# Altium schematic symbol library IC_Maxim.SchLib: 843 symbols (part 18 of 20)
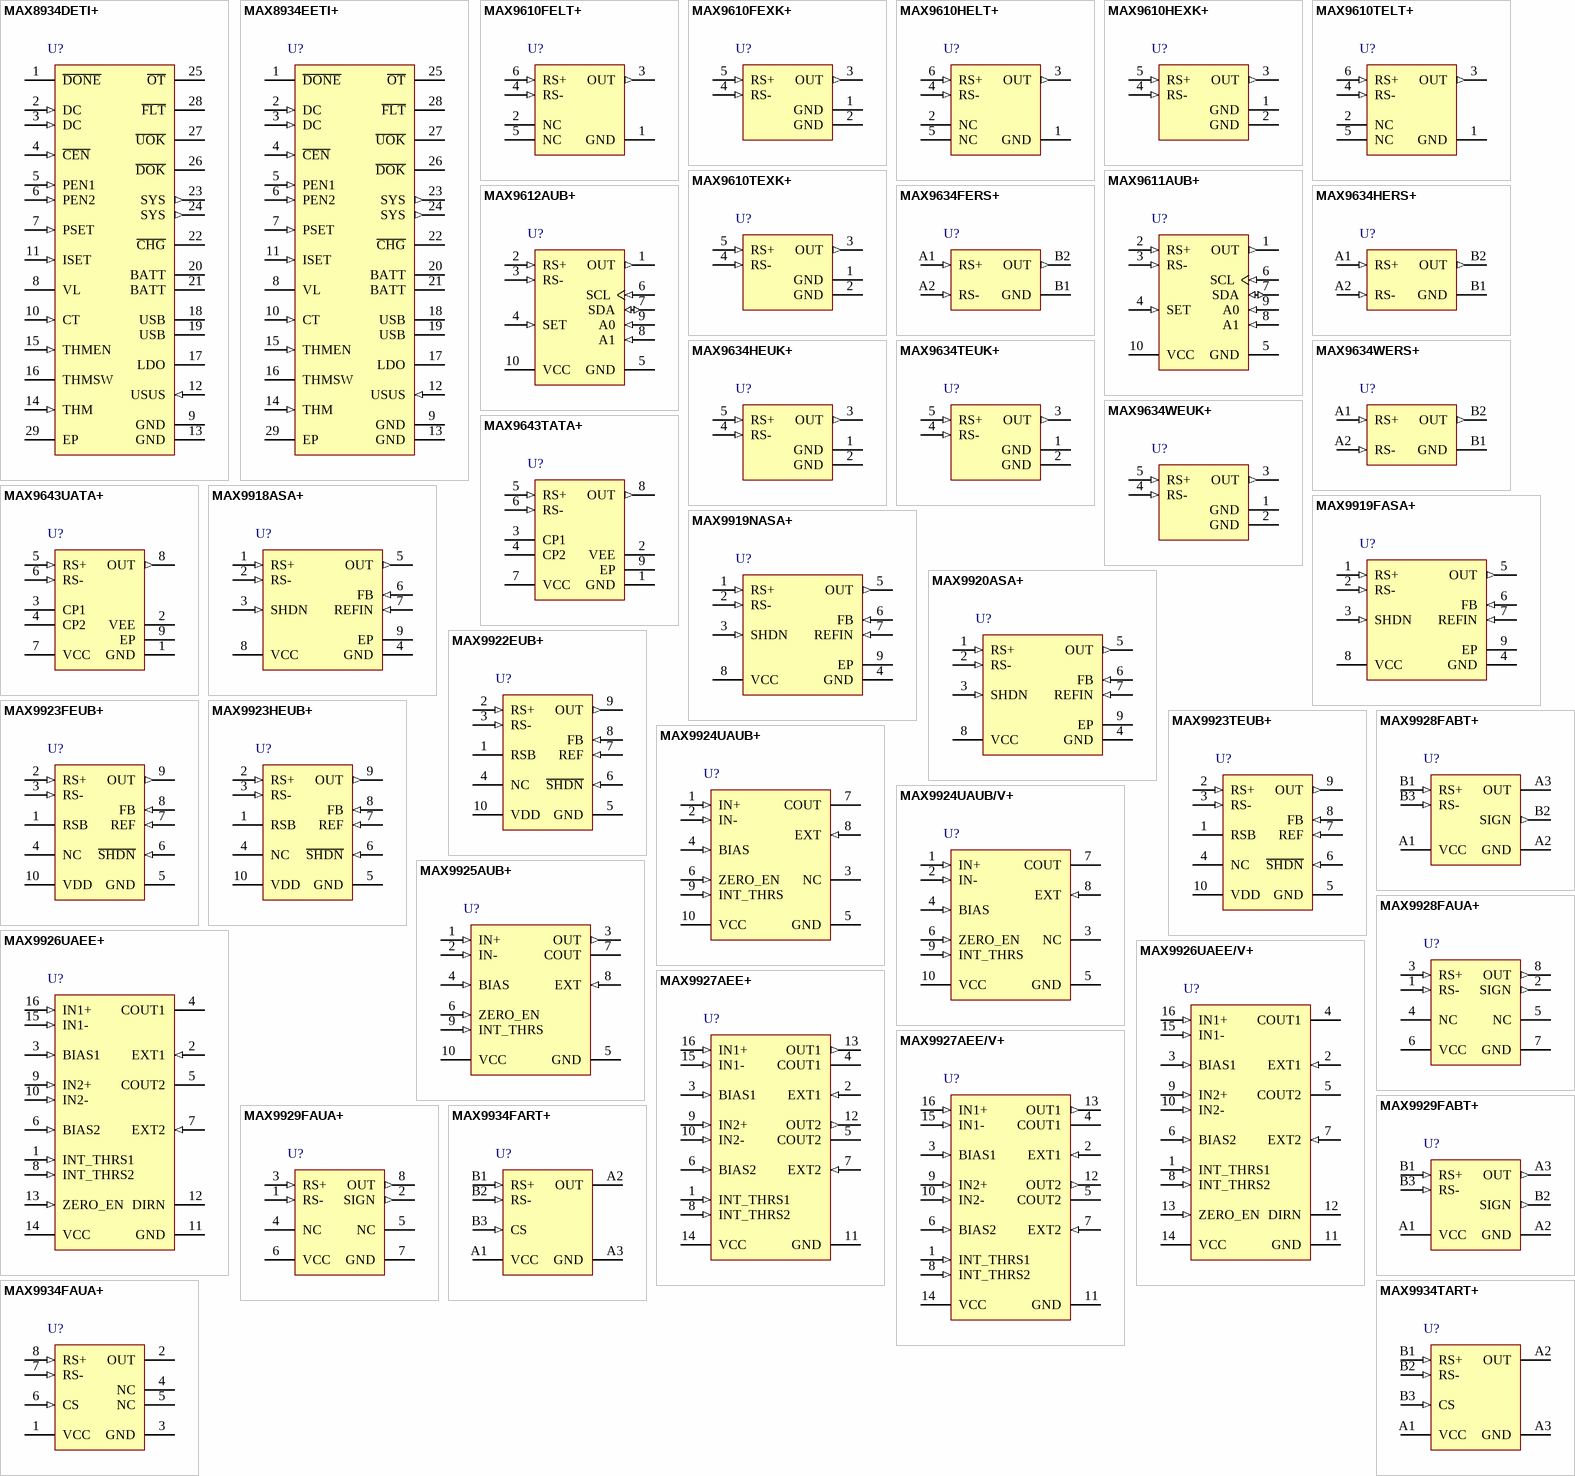
[diagram p41: symbols MAX8934DETI+ to MAX9934TART+]

## MAX9612AUB+
designator U?
High-side Current-Sense Amplifier with 12-bit I2C ADC and Op Amp / Comparator - Inverting, Adjustable Gain, -40 to 125 degC, 10-Pin SOP (U10+2), Pb-Free; PartNumber: MAX9612AUB+; Bi-Dir. Curr. Sense: No; Gain: Adj.; DatasheetVersion: Rev. 3; PackageVersion: Rev. L, 07/2008; PackageReference: U10+2; PackageDescription: 10-Pin Micro-MAX, Thin Shrink Small-Outline (U10+2), Body 3 x 3 mm, Pitch 0.5 mm; Supplier Part Number 1: MAX9612AUB+-ND; Supplier Part Number 2: 700-MAX9612AUB+; Mounting Technology: Surface Mount; Code_JEDEC: MO-187; ComponentLink1Description: Manufacturer URL; ComponentLink1URL: http://www.maximintegrated.com/; ComponentLink2Description: Datasheet; ComponentLink2URL: http://datasheets.maximintegrated.com/en/ds/MAX9611-MAX9612.pdf; ComponentLink3Description: Package Specification; ComponentLink3URL: http://pdfserv.maximintegrated.com/package_dwgs/21-0061.PDF
footprint VSSOP10_0.5 (Footprint not found)
pins: 1 OUT (out) "Internal Amplifier/Comparator Output", 2 RS+ (in) "Positive Current-Sensing Input. Power side connects to external sense resistor.", 3 RS- (in) "Negative Current-Sensing Input. Load side connects to external sense resistor.", 4 SET (in) "External Set-Point Voltage", 5 GND (power) "Ground", 6 SCL (in) "I2C Interface Clock Input", 7 SDA (io) "I2C Interface Data Input/Output", 8 A1 (in) "Address Input 1", 9 A0 (in) "Address Input 0", 10 VCC (power) "Supply Voltage Input. Bypass VCC to GND with a 0.1uF and a 4.7uF capacitor in parallel."

## MAX9634FERS+
designator U?
1 uA, 4-Bump, Precision Current-Sense Amplifier, 50 V / V Gain, -40 to 85 degC, 4-Pin BGA (R41A1+1), Pb-Free; PartNumber: MAX9634FERS+; Bi-Dir. Curr. Sense: No; Gain: 25 V/V, 50 V/V ,100 V/V ,200 V/V; DatasheetVersion: Rev. 2; PackageVersion: Rev. A, 06/2008; PackageReference: R41A1+1; PackageDescription: 4-Pin Ultra Chip-Scale Package, Body 1 x 1 mm, Pitch 0.5 mm; Supplier Part Number 1: N/A; Mounting Technology: Surface Mount; ComponentLink1Description: Manufacturer URL; ComponentLink1URL: http://www.maximintegrated.com/; ComponentLink2Description: Datasheet; ComponentLink2URL: http://datasheets.maximintegrated.com/en/ds/MAX9634.pdf; ComponentLink3Description: Package Specification; ComponentLink3URL: http://pdfserv.maximintegrated.com/package_dwgs/21-0242.PDF
footprint BGA4_0.5(1x1) (Footprint not found)
pins: A1 RS+ (in) "External Sense Resistor Power-Side Connection", A2 RS- (in) "External Sense Resistor Load-Side Connection", B1 GND (power) "Ground", B2 OUT (out) "Output Voltage. VOUT is proportional to VSENSE = VRS+ - VRS-."

## MAX9634HERS+
designator U?
1 uA, 4-Bump, Precision Current-Sense Amplifier, 100 V / V Gain, -40 to 85 degC, 4-Pin BGA (R41A1+1), Pb-Free; PartNumber: MAX9634HERS+; Bi-Dir. Curr. Sense: No; Gain: 25 V/V, 50 V/V ,100 V/V ,200 V/V; DatasheetVersion: Rev. 2; PackageVersion: Rev. A, 06/2008; PackageReference: R41A1+1; PackageDescription: 4-Pin Ultra Chip-Scale Package, Body 1 x 1 mm, Pitch 0.5 mm; Supplier Part Number 1: N/A; Mounting Technology: Surface Mount; ComponentLink1Description: Manufacturer URL; ComponentLink1URL: http://www.maximintegrated.com/; ComponentLink2Description: Datasheet; ComponentLink2URL: http://datasheets.maximintegrated.com/en/ds/MAX9634.pdf; ComponentLink3Description: Package Specification; ComponentLink3URL: http://pdfserv.maximintegrated.com/package_dwgs/21-0242.PDF
footprint BGA4_0.5(1x1) (Footprint not found)
pins: A1 RS+ (in) "External Sense Resistor Power-Side Connection", A2 RS- (in) "External Sense Resistor Load-Side Connection", B1 GND (power) "Ground", B2 OUT (out) "Output Voltage. VOUT is proportional to VSENSE = VRS+ - VRS-."

## MAX9634HEUK+
designator U?
1 uA, 4-Bump, Precision Current-Sense Amplifier, 100 V / V Gain, -40 to 85 degC, 5-Pin SOT23 (U5+2), Pb-Free; PartNumber: MAX9634HEUK+; Bi-Dir. Curr. Sense: No; Gain: 25 V/V, 50 V/V ,100 V/V ,200 V/V; DatasheetVersion: Rev. 2; PackageVersion: Rev. G, 04/2011; PackageReference: U5+2; PackageDescription: 5-Pin Small-Outline Transistor Package, Body 1.625 x 2.9 mm, Pitch 0.95 mm; Supplier Part Number 1: N/A; Mounting Technology: Surface Mount; Code_JEDEC: MO178; ComponentLink1Description: Manufacturer URL; ComponentLink1URL: http://www.maximintegrated.com/; ComponentLink2Description: Datasheet; ComponentLink2URL: http://datasheets.maximintegrated.com/en/ds/MAX9634.pdf; ComponentLink3Description: Package Specification; ComponentLink3URL: http://pdfserv.maximintegrated.com/package_dwgs/21-0057.PDF
footprint SOT23-5 (Footprint not found)
pins: 1 GND (power) "Ground", 2 GND (power) "Ground", 3 OUT (out) "Output", 4 RS- (in) "Load- Side Connection to External Sense Resistor", 5 RS+ (in) "Power-Side Connection to External Sense Resistor"

## MAX9634TEUK+
designator U?
1 uA, 4-Bump, Precision Current-Sense Amplifier, 25 V / V Gain, -40 to 85 degC, 5-Pin SOT23 (U5+2), Pb-Free; PartNumber: MAX9634TEUK+; Bi-Dir. Curr. Sense: No; Gain: 25 V/V, 50 V/V ,100 V/V ,200 V/V; DatasheetVersion: Rev. 2; PackageVersion: Rev. G, 04/2011; PackageReference: U5+2; PackageDescription: 5-Pin Small-Outline Transistor Package, Body 1.625 x 2.9 mm, Pitch 0.95 mm; Supplier Part Number 1: N/A; Mounting Technology: Surface Mount; Code_JEDEC: MO178; ComponentLink1Description: Manufacturer URL; ComponentLink1URL: http://www.maximintegrated.com/; ComponentLink2Description: Datasheet; ComponentLink2URL: http://datasheets.maximintegrated.com/en/ds/MAX9634.pdf; ComponentLink3Description: Package Specification; ComponentLink3URL: http://pdfserv.maximintegrated.com/package_dwgs/21-0057.PDF
footprint SOT23-5 (Footprint not found)
pins: 1 GND (power) "Ground", 2 GND (power) "Ground", 3 OUT (out) "Output", 4 RS- (in) "Load- Side Connection to External Sense Resistor", 5 RS+ (in) "Power-Side Connection to External Sense Resistor"

## MAX9634WERS+
designator U?
1 uA, 4-Bump, Precision Current-Sense Amplifier, 200 V / V Gain, -40 to 85 degC, 4-Pin BGA (R41A1+1), Pb-Free; PartNumber: MAX9634WERS+; Bi-Dir. Curr. Sense: No; Gain: 25 V/V, 50 V/V ,100 V/V ,200 V/V; DatasheetVersion: Rev. 2; PackageVersion: Rev. A, 06/2008; PackageReference: R41A1+1; PackageDescription: 4-Pin Ultra Chip-Scale Package, Body 1 x 1 mm, Pitch 0.5 mm; Supplier Part Number 1: N/A; Mounting Technology: Surface Mount; ComponentLink1Description: Manufacturer URL; ComponentLink1URL: http://www.maximintegrated.com/; ComponentLink2Description: Datasheet; ComponentLink2URL: http://datasheets.maximintegrated.com/en/ds/MAX9634.pdf; ComponentLink3Description: Package Specification; ComponentLink3URL: http://pdfserv.maximintegrated.com/package_dwgs/21-0242.PDF
footprint BGA4_0.5(1x1) (Footprint not found)
pins: A1 RS+ (in) "External Sense Resistor Power-Side Connection", A2 RS- (in) "External Sense Resistor Load-Side Connection", B1 GND (power) "Ground", B2 OUT (out) "Output Voltage. VOUT is proportional to VSENSE = VRS+ - VRS-."

## MAX9634WEUK+
designator U?
1 uA, 4-Bump, Precision Current-Sense Amplifier, 200 V / V Gain, -40 to 85 degC, 5-Pin SOT23 (U5+2), Pb-Free; PartNumber: MAX9634WEUK+; Bi-Dir. Curr. Sense: No; Gain: 25 V/V, 50 V/V ,100 V/V ,200 V/V; DatasheetVersion: Rev. 2; PackageVersion: Rev. G, 04/2011; PackageReference: U5+2; PackageDescription: 5-Pin Small-Outline Transistor Package, Body 1.625 x 2.9 mm, Pitch 0.95 mm; Supplier Part Number 1: N/A; Mounting Technology: Surface Mount; Code_JEDEC: MO178; ComponentLink1Description: Manufacturer URL; ComponentLink1URL: http://www.maximintegrated.com/; ComponentLink2Description: Datasheet; ComponentLink2URL: http://datasheets.maximintegrated.com/en/ds/MAX9634.pdf; ComponentLink3Description: Package Specification; ComponentLink3URL: http://pdfserv.maximintegrated.com/package_dwgs/21-0057.PDF
footprint SOT23-5 (Footprint not found)
pins: 1 GND (power) "Ground", 2 GND (power) "Ground", 3 OUT (out) "Output", 4 RS- (in) "Load- Side Connection to External Sense Resistor", 5 RS+ (in) "Power-Side Connection to External Sense Resistor"

## MAX9643TATA+
designator U?
60 V High-Speed Precision Current-Sense Amplifier, 2.5V / V Gain, -40 to 125 degC, 8-Pin SON (T823+1), Pb-Free; PartNumber: MAX9643TATA+; Bi-Dir. Curr. Sense: No; Gain: 2.5V/V, 10V/V; DatasheetVersion: Rev. 0; PackageVersion: Rev. C, 04/2011; PackageReference: T823+1; PackageDescription: 8-Pin Plastic Very Very Thin Dual Flatpack No Leads, Body 3 x 2 mm, Exposed Pad 1.63 x 1.75 mm, Pitch 0.5 mm; Supplier Part Number 1: 700-MAX9643TATA+; Mounting Technology: Surface Mount; Code_JEDEC: MO-229; ComponentLink1Description: Manufacturer URL; ComponentLink1URL: http://www.maximintegrated.com/; ComponentLink2Description: Datasheet; ComponentLink2URL: http://datasheets.maximintegrated.com/en/ds/MAX9643.pdf; ComponentLink3Description: Package Specification; ComponentLink3URL: http://pdfserv.maximintegrated.com/package_dwgs/21-0174.PDF
footprint DFN8_0.5-PAD(3X2) (Footprint not found)
pins: 1 GND (power) "Ground", 2 VEE (power) "Charge-Pump Output. Connect 1uF to GND.", 3 CP1 "Positive Terminal of 1uF Flying Capacitor", 4 CP2 "Negative Terminal of 1uF Flying Capacitor", 5 RS+ (in) "Positive Sense Resistor Input", 6 RS- (in) "Negative Sense Resistor Input", 7 VCC (power) "Power Supply", 8 OUT (out) "Output", 9 EP (power) "Exposed Pad. Must be externally connected to GND."

## MAX9643UATA+
designator U?
60 V High-Speed Precision Current-Sense Amplifier, 10 V / V Gain, -40 to 125 degC, 8-Pin SON (T823+1), Pb-Free; PartNumber: MAX9643UATA+; Bi-Dir. Curr. Sense: No; Gain: 2.5V/V, 10V/V; DatasheetVersion: Rev. 0; PackageVersion: Rev. C, 04/2011; PackageReference: T823+1; PackageDescription: 8-Pin Plastic Very Very Thin Dual Flatpack No Leads, Body 3 x 2 mm, Exposed Pad 1.63 x 1.75 mm, Pitch 0.5 mm; Supplier Part Number 1: N/A; Mounting Technology: Surface Mount; Code_JEDEC: MO-229; ComponentLink1Description: Manufacturer URL; ComponentLink1URL: http://www.maximintegrated.com/; ComponentLink2Description: Datasheet; ComponentLink2URL: http://datasheets.maximintegrated.com/en/ds/MAX9643.pdf; ComponentLink3Description: Package Specification; ComponentLink3URL: http://pdfserv.maximintegrated.com/package_dwgs/21-0174.PDF
footprint DFN8_0.5-PAD(3X2) (Footprint not found)
pins: 1 GND (power) "Ground", 2 VEE (power) "Charge-Pump Output. Connect 1uF to GND.", 3 CP1 "Positive Terminal of 1uF Flying Capacitor", 4 CP2 "Negative Terminal of 1uF Flying Capacitor", 5 RS+ (in) "Positive Sense Resistor Input", 6 RS- (in) "Negative Sense Resistor Input", 7 VCC (power) "Power Supply", 8 OUT (out) "Output", 9 EP (power) "Exposed Pad. Must be externally connected to GND."

## MAX9918ASA+
designator U?
-20 to 75 V Input Range, Precision Uni- / Bidirectional, Current-Sense Amplifier, Adjustable Gain, -40 to 125 degC, 8-Pin SOIC (S8E+14), Pb-Free; PartNumber: MAX9918ASA+; Bi-Dir. Curr. Sense: Yes; Gain: Adj.; Industry Qualified: Automotive - AECQ100, Automotive - General; DatasheetVersion: Rev. 4; PackageVersion: Rev. E, 01/2009; PackageReference: S8E+14; PackageDescription: 8-Pin Small-Outline IC, Narrow, Body 3.9 x 4.89 mm, Exposed Pad 2.945 x 2.26 mm, Pitch 1.27 mm; Supplier Part Number 1: MAX9918ASA+-ND; Supplier Part Number 2: 700-MAX9918ASA+; Mounting Technology: Surface Mount; Code_JEDEC: MS-012; ComponentLink1Description: Manufacturer URL; ComponentLink1URL: http://www.maximintegrated.com/; ComponentLink2Description: Datasheet; ComponentLink2URL: http://datasheets.maximintegrated.com/en/ds/MAX9918-MAX9920.pdf; ComponentLink3Description: Package Specification; ComponentLink3URL: http://pdfserv.maximintegrated.com/package_dwgs/21-0111.PDF
footprint SOIC8_1.27-PAD (Footprint not found)
pins: 1 RS+ (in) "Positive Current-Sensing Input. Power side connects to external sense resistor.", 2 RS- (in) "Negative Current-Sensing Input. Load side connects to external sense resistor.", 3 SHDN (in) "Active-High Shutdown Input. Connect to GND for normal operation.", 4 GND (power) "Ground", 5 OUT (out) "Current-Sense Output. VOUT is proportional to VSENSE.", 6 FB (in) "Feedback Input. Connect FB to a resistive-divider network to set the gain for the MAX9918 and MAX9920. See the Adjustable Gain (MAX9918/MAX9920) section for more information. Leave FB unconnected for the MAX9919 for proper (See Datasheet)", 7 REFIN (in) "Reference Input. Set REFIN to VCC/2 for bidirectional operation. Set REFIN to GND for unidirectional operation.", 8 VCC (power) "5V Supply Voltage Input. Bypass VCC to GND with 0.1uF capacitor.", 9 EP (power) "Exposed Pad. Connect to a large-area contiguous ground plane for improved power dissipation. Do not use as the only ground connection for the part."

## MAX9919FASA+
designator U?
-20 to 75 V Input Range, Precision Uni- / Bidirectional, Current-Sense Amplifier, 45 V / V Gain, -40 to 125 degC, 8-Pin SOIC (S8E+14), Pb-Free; PartNumber: MAX9919FASA+; Bi-Dir. Curr. Sense: Yes; Gain: 45 V/V, 90 V/V; Industry Qualified: Automotive - AECQ100, Automotive - General; DatasheetVersion: Rev. 4; PackageVersion: Rev. E, 01/2009; PackageReference: S8E+14; PackageDescription: 8-Pin Small-Outline IC, Narrow, Body 3.9 x 4.89 mm, Exposed Pad 2.945 x 2.26 mm, Pitch 1.27 mm; Supplier Part Number 1: MAX9919FASA+-ND; Supplier Part Number 2: 700-MAX9919FASA+; Mounting Technology: Surface Mount; Code_JEDEC: MS-012; ComponentLink1Description: Manufacturer URL; ComponentLink1URL: http://www.maximintegrated.com/; ComponentLink2Description: Datasheet; ComponentLink2URL: http://datasheets.maximintegrated.com/en/ds/MAX9918-MAX9920.pdf; ComponentLink3Description: Package Specification; ComponentLink3URL: http://pdfserv.maximintegrated.com/package_dwgs/21-0111.PDF
footprint SOIC8_1.27-PAD (Footprint not found)
pins: 1 RS+ (in) "Positive Current-Sensing Input. Power side connects to external sense resistor.", 2 RS- (in) "Negative Current-Sensing Input. Load side connects to external sense resistor.", 3 SHDN (in) "Active-High Shutdown Input. Connect to GND for normal operation.", 4 GND (power) "Ground", 5 OUT (out) "Current-Sense Output. VOUT is proportional to VSENSE.", 6 FB (in) "Feedback Input. Connect FB to a resistive-divider network to set the gain for the MAX9918 and MAX9920. See the Adjustable Gain (MAX9918/MAX9920) section for more information. Leave FB unconnected for the MAX9919 for proper (See Datasheet)", 7 REFIN (in) "Reference Input. Set REFIN to VCC/2 for bidirectional operation. Set REFIN to GND for unidirectional operation.", 8 VCC (power) "5V Supply Voltage Input. Bypass VCC to GND with 0.1uF capacitor.", 9 EP (power) "Exposed Pad. Connect to a large-area contiguous ground plane for improved power dissipation. Do not use as the only ground connection for the part."

## MAX9919NASA+
designator U?
-20 to 75 V Input Range, Precision Uni- / Bidirectional, Current-Sense Amplifier, 90 V / V Gain, -40 to 125 degC, 8-Pin SOIC (S8E+14), Pb-Free; PartNumber: MAX9919NASA+; Bi-Dir. Curr. Sense: Yes; Gain: 45 V/V, 90 V/V; Industry Qualified: Automotive - AECQ100, Automotive - General; DatasheetVersion: Rev. 4; PackageVersion: Rev. E, 01/2009; PackageReference: S8E+14; PackageDescription: 8-Pin Small-Outline IC, Narrow, Body 3.9 x 4.89 mm, Exposed Pad 2.945 x 2.26 mm, Pitch 1.27 mm; Supplier Part Number 1: MAX9919NASA+-ND; Supplier Part Number 2: 700-MAX9919NASA+; Mounting Technology: Surface Mount; Code_JEDEC: MS-012; ComponentLink1Description: Manufacturer URL; ComponentLink1URL: http://www.maximintegrated.com/; ComponentLink2Description: Datasheet; ComponentLink2URL: http://datasheets.maximintegrated.com/en/ds/MAX9918-MAX9920.pdf; ComponentLink3Description: Package Specification; ComponentLink3URL: http://pdfserv.maximintegrated.com/package_dwgs/21-0111.PDF
footprint SOIC8_1.27-PAD (Footprint not found)
pins: 1 RS+ (in) "Positive Current-Sensing Input. Power side connects to external sense resistor.", 2 RS- (in) "Negative Current-Sensing Input. Load side connects to external sense resistor.", 3 SHDN (in) "Active-High Shutdown Input. Connect to GND for normal operation.", 4 GND (power) "Ground", 5 OUT (out) "Current-Sense Output. VOUT is proportional to VSENSE.", 6 FB (in) "Feedback Input. Connect FB to a resistive-divider network to set the gain for the MAX9918 and MAX9920. See the Adjustable Gain (MAX9918/MAX9920) section for more information. Leave FB unconnected for the MAX9919 for proper (See Datasheet)", 7 REFIN (in) "Reference Input. Set REFIN to VCC/2 for bidirectional operation. Set REFIN to GND for unidirectional operation.", 8 VCC (power) "5V Supply Voltage Input. Bypass VCC to GND with 0.1uF capacitor.", 9 EP (power) "Exposed Pad. Connect to a large-area contiguous ground plane for improved power dissipation. Do not use as the only ground connection for the part."

## MAX9920ASA+
designator U?
-20 to 75 V Input Range, Precision Uni- / Bidirectional, Current-Sense Amplifier, Adjustable Gain, -40 to 125 degC, 8-Pin SOIC (S8E+14), Pb-Free; PartNumber: MAX9920ASA+; Bi-Dir. Curr. Sense: Yes; Gain: Adj.; Industry Qualified: Automotive - AECQ100, Automotive - General; DatasheetVersion: Rev. 4; PackageVersion: Rev. E, 01/2009; PackageReference: S8E+14; PackageDescription: 8-Pin Small-Outline IC, Narrow, Body 3.9 x 4.89 mm, Exposed Pad 2.945 x 2.26 mm, Pitch 1.27 mm; Supplier Part Number 1: MAX9920ASA+-ND; Supplier Part Number 2: 700-MAX9920ASA+; Mounting Technology: Surface Mount; Code_JEDEC: MS-012; ComponentLink1Description: Manufacturer URL; ComponentLink1URL: http://www.maximintegrated.com/; ComponentLink2Description: Datasheet; ComponentLink2URL: http://datasheets.maximintegrated.com/en/ds/MAX9918-MAX9920.pdf; ComponentLink3Description: Package Specification; ComponentLink3URL: http://pdfserv.maximintegrated.com/package_dwgs/21-0111.PDF
footprint SOIC8_1.27-PAD (Footprint not found)
pins: 1 RS+ (in) "Positive Current-Sensing Input. Power side connects to external sense resistor.", 2 RS- (in) "Negative Current-Sensing Input. Load side connects to external sense resistor.", 3 SHDN (in) "Active-High Shutdown Input. Connect to GND for normal operation.", 4 GND (power) "Ground", 5 OUT (out) "Current-Sense Output. VOUT is proportional to VSENSE.", 6 FB (in) "Feedback Input. Connect FB to a resistive-divider network to set the gain for the MAX9918 and MAX9920. See the Adjustable Gain (MAX9918/MAX9920) section for more information. Leave FB unconnected for the MAX9919 for proper (See Datasheet)", 7 REFIN (in) "Reference Input. Set REFIN to VCC/2 for bidirectional operation. Set REFIN to GND for unidirectional operation.", 8 VCC (power) "5V Supply Voltage Input. Bypass VCC to GND with 0.1uF capacitor.", 9 EP (power) "Exposed Pad. Connect to a large-area contiguous ground plane for improved power dissipation. Do not use as the only ground connection for the part."

## MAX9922EUB+
designator U?
Ultra-precision, High-side Current-Sense Amplifier, Adjustable Gain, -40 to 85 degC, 10-Pin SOP (U10+2), Pb-Free; PartNumber: MAX9922EUB+; Bi-Dir. Curr. Sense: Yes; Gain: Adj.; DatasheetVersion: Rev. 1; PackageVersion: Rev. L, 07/2008; PackageReference: U10+2; PackageDescription: 10-Pin Micro-MAX, Thin Shrink Small-Outline (U10+2), Body 3 x 3 mm, Pitch 0.5 mm; Supplier Part Number 1: MAX9922EUB+-ND; Supplier Part Number 2: 700-MAX9922EUB; Mounting Technology: Surface Mount; Code_JEDEC: MO-187; ComponentLink1Description: Manufacturer URL; ComponentLink1URL: http://www.maximintegrated.com/; ComponentLink2Description: Datasheet; ComponentLink2URL: http://datasheets.maximintegrated.com/en/ds/MAX9922-MAX9923.pdf; ComponentLink3Description: Package Specification; ComponentLink3URL: http://pdfserv.maximintegrated.com/package_dwgs/21-0061.PDF
footprint VSSOP10_0.5 (Footprint not found)
pins: 1 RSB (power) "Current-Sense Amplifier Input Stage Supply. Connect to either RS+ or RS-.", 2 RS+ (in) "Current-Sense Amplifier Positive Input", 3 RS- (in) "Current-Sense Amplifier Negative Input", 4 NC "No Connection. Not internally connected.", 5 GND (power) "Ground", 6 ~{SHDN} (in) "Shutdown Logic Input. Connect to GND to reduce quiescent current to 1uA. Connect to VDD for normal operation.", 7 REF (in) "Reference Voltage Input. Connect to an external voltage to provide a bidirectional current-sense output. Connect to GND for unidirectional operation.", 8 FB (in) "Gain-Set Feedback Input. Connect an optional noise reduction capacitor between OUT and FB.Fixed gain. See the Functional Diagrams.", 9 OUT (out) "Voltage Output. VOUT is proportional to VSENSE.", 10 VDD (power) "Power-Supply Voltage Input. Bypass to GND with a 0.1礔 capacitor."

## MAX9923FEUB+
designator U?
Ultra-Precision, High-Side Current-Sense Amplifier with Fixed Gain, 250 V / V Gain, -40 to 85 degC, 10-Pin SOP (U10+2), Pb-Free; PartNumber: MAX9923FEUB+; Bi-Dir. Curr. Sense: Yes; Gain: 25 V/V, 100 V/V ,250 V/V; DatasheetVersion: Rev. 1; PackageVersion: Rev. L, 07/2008; PackageReference: U10+2; PackageDescription: 10-Pin Micro-MAX, Thin Shrink Small-Outline (U10+2), Body 3 x 3 mm, Pitch 0.5 mm; Supplier Part Number 1: MAX9923FEUB+-ND; Supplier Part Number 2: 700-MAX9923FEUB; Mounting Technology: Surface Mount; Code_JEDEC: MO-187; ComponentLink1Description: Manufacturer URL; ComponentLink1URL: http://www.maximintegrated.com/; ComponentLink2Description: Datasheet; ComponentLink2URL: http://datasheets.maximintegrated.com/en/ds/MAX9922-MAX9923.pdf; ComponentLink3Description: Package Specification; ComponentLink3URL: http://pdfserv.maximintegrated.com/package_dwgs/21-0061.PDF
footprint VSSOP10_0.5 (Footprint not found)
pins: 1 RSB (power) "Current-Sense Amplifier Input Stage Supply. Connect to either RS+ or RS-.", 2 RS+ (in) "Current-Sense Amplifier Positive Input", 3 RS- (in) "Current-Sense Amplifier Negative Input", 4 NC "No Connection. Not internally connected.", 5 GND (power) "Ground", 6 ~{SHDN} (in) "Shutdown Logic Input. Connect to GND to reduce quiescent current to 1uA. Connect to VDD for normal operation.", 7 REF (in) "Reference Voltage Input. Connect to an external voltage to provide a bidirectional current-sense output. Connect to GND for unidirectional operation.", 8 FB (in) "Gain-Set Feedback Input. Connect an optional noise reduction capacitor between OUT and FB.Fixed gain. See the Functional Diagrams.", 9 OUT (out) "Voltage Output. VOUT is proportional to VSENSE.", 10 VDD (power) "Power-Supply Voltage Input. Bypass to GND with a 0.1礔 capacitor."

## MAX9923HEUB+
designator U?
Ultra-Precision, High-Side Current-Sense Amplifier with Fixed Gain, 100 V / V Gain, -40 to 85 degC, 10-Pin SOP (U10+2), Pb-Free; PartNumber: MAX9923HEUB+; Bi-Dir. Curr. Sense: Yes; Gain: 25 V/V, 100 V/V ,250 V/V; DatasheetVersion: Rev. 1; PackageVersion: Rev. L, 07/2008; PackageReference: U10+2; PackageDescription: 10-Pin Micro-MAX, Thin Shrink Small-Outline (U10+2), Body 3 x 3 mm, Pitch 0.5 mm; Supplier Part Number 1: MAX9923HEUB+-ND; Supplier Part Number 2: 700-MAX9923HEUB; Mounting Technology: Surface Mount; Code_JEDEC: MO-187; ComponentLink1Description: Manufacturer URL; ComponentLink1URL: http://www.maximintegrated.com/; ComponentLink2Description: Datasheet; ComponentLink2URL: http://datasheets.maximintegrated.com/en/ds/MAX9922-MAX9923.pdf; ComponentLink3Description: Package Specification; ComponentLink3URL: http://pdfserv.maximintegrated.com/package_dwgs/21-0061.PDF
footprint VSSOP10_0.5 (Footprint not found)
pins: 1 RSB (power) "Current-Sense Amplifier Input Stage Supply. Connect to either RS+ or RS-.", 2 RS+ (in) "Current-Sense Amplifier Positive Input", 3 RS- (in) "Current-Sense Amplifier Negative Input", 4 NC "No Connection. Not internally connected.", 5 GND (power) "Ground", 6 ~{SHDN} (in) "Shutdown Logic Input. Connect to GND to reduce quiescent current to 1uA. Connect to VDD for normal operation.", 7 REF (in) "Reference Voltage Input. Connect to an external voltage to provide a bidirectional current-sense output. Connect to GND for unidirectional operation.", 8 FB (in) "Gain-Set Feedback Input. Connect an optional noise reduction capacitor between OUT and FB.Fixed gain. See the Functional Diagrams.", 9 OUT (out) "Voltage Output. VOUT is proportional to VSENSE.", 10 VDD (power) "Power-Supply Voltage Input. Bypass to GND with a 0.1礔 capacitor."

## MAX9923TEUB+
designator U?
Ultra-Precision, High-Side Current-Sense Amplifier with Fixed Gain, 25 V / V Gain, -40 to 85 degC, 10-Pin SOP (U10+2), Pb-Free; PartNumber: MAX9923TEUB+; Bi-Dir. Curr. Sense: Yes; Gain: 25 V/V, 100 V/V ,250 V/V; DatasheetVersion: Rev. 1; PackageVersion: Rev. L, 07/2008; PackageReference: U10+2; PackageDescription: 10-Pin Micro-MAX, Thin Shrink Small-Outline (U10+2), Body 3 x 3 mm, Pitch 0.5 mm; Supplier Part Number 1: MAX9923TEUB+-ND; Supplier Part Number 2: 700-MAX9923TEUB; Mounting Technology: Surface Mount; Code_JEDEC: MO-187; ComponentLink1Description: Manufacturer URL; ComponentLink1URL: http://www.maximintegrated.com/; ComponentLink2Description: Datasheet; ComponentLink2URL: http://datasheets.maximintegrated.com/en/ds/MAX9922-MAX9923.pdf; ComponentLink3Description: Package Specification; ComponentLink3URL: http://pdfserv.maximintegrated.com/package_dwgs/21-0061.PDF
footprint VSSOP10_0.5 (Footprint not found)
pins: 1 RSB (power) "Current-Sense Amplifier Input Stage Supply. Connect to either RS+ or RS-.", 2 RS+ (in) "Current-Sense Amplifier Positive Input", 3 RS- (in) "Current-Sense Amplifier Negative Input", 4 NC "No Connection. Not internally connected.", 5 GND (power) "Ground", 6 ~{SHDN} (in) "Shutdown Logic Input. Connect to GND to reduce quiescent current to 1uA. Connect to VDD for normal operation.", 7 REF (in) "Reference Voltage Input. Connect to an external voltage to provide a bidirectional current-sense output. Connect to GND for unidirectional operation.", 8 FB (in) "Gain-Set Feedback Input. Connect an optional noise reduction capacitor between OUT and FB.Fixed gain. See the Functional Diagrams.", 9 OUT (out) "Voltage Output. VOUT is proportional to VSENSE.", 10 VDD (power) "Power-Supply Voltage Input. Bypass to GND with a 0.1礔 capacitor."

## MAX9924UAUB+
designator U?
Single-Channel, Variable Reluctance Sensor Interface with No Low Power Shutdown, 4.5 to 5.5 V, -40 to 125 degC, 10-Pin SOP (U10+2), Pb-Free; Generic Part Number: MAX9924; PartNumber: MAX9924UAUB+; Channels: 1; Industry Qualified: Automotive - AECQ100, Automotive - General; DatasheetVersion: Rev. 4; PackageVersion: Rev. L, 07/2008; PackageReference: U10+2; PackageDescription: 10-Pin Micro-MAX, Thin Shrink Small-Outline (U10+2), Body 3 x 3 mm, Pitch 0.5 mm; Supplier Part Number 1: MAX9924UAUB+-ND; Supplier Part Number 2: 700-MAX9924UAUB; Low Pwr. Shutdn: No; Mounting Technology: Surface Mount; Code_JEDEC: MO-187; ComponentLink1Description: Manufacturer URL; ComponentLink1URL: http://www.maximintegrated.com/; ComponentLink2Description: Datasheet; ComponentLink2URL: http://datasheets.maximintegrated.com/en/ds/MAX9924-MAX9927.pdf; ComponentLink3Description: Package Specification; ComponentLink3URL: http://pdfserv.maximintegrated.com/package_dwgs/21-0061.PDF
footprint VSSOP10_0.5 (Footprint not found)
pins: 1 IN+ (in) "Noninverting Input", 2 IN- (in) "Inverting Input", 3 NC "No Connection. Not internally connected.", 4 BIAS (in) "Input Bias. Connect to an external resistor-divider and bypass to ground with a 0.1uF and 10uF capacitor.", 5 GND (power) "Ground", 6 ZERO_EN (in) "Zero-Crossing Enable. Mode configuration pin, internally pulled up to VCC with 10k ohm resistor.", 7 COUT (oc) "Comparator Output. Open-drain output, connect a 10k ohm pullup resistor from COUT to VPULLUP.", 8 EXT (in) "External Reference Input. Leave EXT unconnected in Modes A1, A2. Apply an external voltage in Modes B, C.", 9 INT_THRS (in) "Internal Adaptive Threshold. Mode configuration pin.", 10 VCC (power) "Power Supply"

## MAX9924UAUB/V+
designator U?
Single-Channel, Variable Reluctance Sensor Interface with No Low Power Shutdown, 4.5 to 5.5 V, -40 to 125 degC, 10-Pin SOP (U10+2), Pb-Free; Generic Part Number: MAX9924; PartNumber: MAX9924UAUB/V+; Channels: 1; Industry Qualified: Automotive - AECQ100, Automotive - General; DatasheetVersion: Rev. 4; PackageVersion: Rev. L, 07/2008; PackageReference: U10+2; PackageDescription: 10-Pin Micro-MAX, Thin Shrink Small-Outline (U10+2), Body 3 x 3 mm, Pitch 0.5 mm; Supplier Part Number 1: MAX9924UAUB/V+-ND; Supplier Part Number 2: 700-MAX9924UAUB/V+; Low Pwr. Shutdn: No; Mounting Technology: Surface Mount; Code_JEDEC: MO-187; ComponentLink1Description: Manufacturer URL; ComponentLink1URL: http://www.maximintegrated.com/; ComponentLink2Description: Datasheet; ComponentLink2URL: http://datasheets.maximintegrated.com/en/ds/MAX9924-MAX9927.pdf; ComponentLink3Description: Package Specification; ComponentLink3URL: http://pdfserv.maximintegrated.com/package_dwgs/21-0061.PDF
footprint VSSOP10_0.5 (Footprint not found)
pins: 1 IN+ (in) "Noninverting Input", 2 IN- (in) "Inverting Input", 3 NC "No Connection. Not internally connected.", 4 BIAS (in) "Input Bias. Connect to an external resistor-divider and bypass to ground with a 0.1uF and 10uF capacitor.", 5 GND (power) "Ground", 6 ZERO_EN (in) "Zero-Crossing Enable. Mode configuration pin, internally pulled up to VCC with 10k ohm resistor.", 7 COUT (oc) "Comparator Output. Open-drain output, connect a 10k ohm pullup resistor from COUT to VPULLUP.", 8 EXT (in) "External Reference Input. Leave EXT unconnected in Modes A1, A2. Apply an external voltage in Modes B, C.", 9 INT_THRS (in) "Internal Adaptive Threshold. Mode configuration pin.", 10 VCC (power) "Power Supply"

## MAX9925AUB+
designator U?
Single-Channel, Variable Reluctance Sensor Interface with Adjustable Gain with and No Low Power Shutdown, 4.5 to 5.5 V, -40 to 125 degC, 10-Pin SOP (U10+2), Pb-Free; Generic Part Number: MAX9925; PartNumber: MAX9925AUB+; Channels: 1; DatasheetVersion: Rev. 4; PackageVersion: Rev. L, 07/2008; PackageReference: U10+2; PackageDescription: 10-Pin Micro-MAX, Thin Shrink Small-Outline (U10+2), Body 3 x 3 mm, Pitch 0.5 mm; Supplier Part Number 1: MAX9925AUB+-ND; Supplier Part Number 2: 700-MAX9925AUB; Low Pwr. Shutdn: No; Mounting Technology: Surface Mount; Code_JEDEC: MO-187; ComponentLink1Description: Manufacturer URL; ComponentLink1URL: http://www.maximintegrated.com/; ComponentLink2Description: Datasheet; ComponentLink2URL: http://datasheets.maximintegrated.com/en/ds/MAX9924-MAX9927.pdf; ComponentLink3Description: Package Specification; ComponentLink3URL: http://pdfserv.maximintegrated.com/package_dwgs/21-0061.PDF
footprint VSSOP10_0.5 (Footprint not found)
pins: 1 IN+ (in) "Noninverting Input", 2 IN- (in) "Inverting Input", 3 OUT (out) "Amplifier Output", 4 BIAS (in) "Input Bias. Connect to an external resistor-divider and bypass to ground with a 0.1μF and 10μF capacitor.", 5 GND (power) "Ground", 6 ZERO_EN (in) "Zero-Crossing Enable. Mode configuration pin, internally pulled up to VCC with 10k ohm resistor.", 7 COUT (oc) "Comparator Output. Open-drain output, connect a 10k ohm pullup resistor from COUT to VPULLUP.", 8 EXT (in) "External Reference Input. Leave EXT unconnected in Modes A1, A2. Apply an external voltage in Modes B, C.", 9 INT_THRS (in) "Internal Adaptive Threshold. Mode configuration pin.", 10 VCC (power) "Power Supply"

## MAX9926UAEE+
designator U?
Dual-Channel, Variable Reluctance Sensor Interface with No Low Power Shutdown, 4.5 to 5.5 V, -40 to 125 degC, 16-Pin SOP (E16+1), Pb-Free; Generic Part Number: MAX9926; PartNumber: MAX9926UAEE+; Channels: 2; Industry Qualified: Automotive - General; DatasheetVersion: Rev. 4; PackageVersion: Rev. K, 04/2012; PackageReference: E16+1; PackageDescription: 16-Pin Quarter Small-Outline Package (E16+1), Body 4.90 x 3.89 mm, Pitch 0.635 mm; Supplier Part Number 1: MAX9926UAEE+-ND; Supplier Part Number 2: 700-MAX9926UAEE; Low Pwr. Shutdn: No; Mounting Technology: Surface Mount; Code_JEDEC: MO137; ComponentLink1Description: Manufacturer URL; ComponentLink1URL: http://www.maximintegrated.com/; ComponentLink2Description: Datasheet; ComponentLink2URL: http://datasheets.maximintegrated.com/en/ds/MAX9924-MAX9927.pdf; ComponentLink3Description: Package Specification; ComponentLink3URL: http://pdfserv.maximintegrated.com/package_dwgs/21-0055.PDF
footprint SSOP16_0.635 (Footprint not found)
pins: 1 INT_THRS1 (in) "Internal Adaptive Threshold 1. Mode configuration pin.", 2 EXT1 (in) "External Reference Input 1. Leave EXT unconnected in Modes A1, A2. Apply an external voltage in Modes B, C.", 3 BIAS1 (in) "Input Bias 1. Connect to an external resistor-divider and bypass to ground with a 0.1uF and 10uF capacitor.", 4 COUT1 (oc) "Comparator Output 1. Open-drain output, connect a 10k ohm pullup resistor from COUT1 to VPULLUP.", 5 COUT2 (oc) "Comparator Output 2. Open-drain output, connect a 10k ohm pullup resistor from COUT2 to VPULLUP.", 6 BIAS2 (in) "Input Bias 2. Connect to an external resistor-divider and bypass to ground with a 0.1uF and 10uF capacitor.", 7 EXT2 (in) "External Reference Input 2. Leave EXT unconnected in Modes A1, A2. Apply an external voltage in Modes B, C.", 8 INT_THRS2 (in) "Internal Adaptive Threshold 2. Mode configuration pin.", 9 IN2+ (in) "Noninverting Input 2", 10 IN2- (in) "Inverting Input 2", 11 GND (power) "Ground", 12 DIRN (oc) "Rotational Direction Output. Open-drain output, connect a pull up resistor from DIRN to VPULLUP.", 13 ZERO_EN (in) "Zero-Crossing Enable. Mode configuration pin, internally pulled up to VCC with 10k ohm resistor", 14 VCC (power) "Power Supply", 15 IN1- (in) "Noninverting Input 1", 16 IN1+ (in) "Inverting Input 1"

## MAX9926UAEE/V+
designator U?
Dual-Channel, Variable Reluctance Sensor Interface with No Low Power Shutdown, 4.5 to 5.5 V, -40 to 125 degC, 16-Pin SOP (E16+1), Pb-Free; Generic Part Number: MAX9926; PartNumber: MAX9926UAEE/V+; Channels: 2; Industry Qualified: Automotive - General; DatasheetVersion: Rev. 4; PackageVersion: Rev. K, 04/2012; PackageReference: E16+1; PackageDescription: 16-Pin Quarter Small-Outline Package (E16+1), Body 4.90 x 3.89 mm, Pitch 0.635 mm; Supplier Part Number 1: MAX9926UAEE/V+-ND; Supplier Part Number 2: 700-MAX9926UAEE/V+; Low Pwr. Shutdn: No; Mounting Technology: Surface Mount; Code_JEDEC: MO137; ComponentLink1Description: Manufacturer URL; ComponentLink1URL: http://www.maximintegrated.com/; ComponentLink2Description: Datasheet; ComponentLink2URL: http://datasheets.maximintegrated.com/en/ds/MAX9924-MAX9927.pdf; ComponentLink3Description: Package Specification; ComponentLink3URL: http://pdfserv.maximintegrated.com/package_dwgs/21-0055.PDF
footprint SSOP16_0.635 (Footprint not found)
pins: 1 INT_THRS1 (in) "Internal Adaptive Threshold 1. Mode configuration pin.", 2 EXT1 (in) "External Reference Input 1. Leave EXT unconnected in Modes A1, A2. Apply an external voltage in Modes B, C.", 3 BIAS1 (in) "Input Bias 1. Connect to an external resistor-divider and bypass to ground with a 0.1uF and 10uF capacitor.", 4 COUT1 (oc) "Comparator Output 1. Open-drain output, connect a 10k ohm pullup resistor from COUT1 to VPULLUP.", 5 COUT2 (oc) "Comparator Output 2. Open-drain output, connect a 10k ohm pullup resistor from COUT2 to VPULLUP.", 6 BIAS2 (in) "Input Bias 2. Connect to an external resistor-divider and bypass to ground with a 0.1uF and 10uF capacitor.", 7 EXT2 (in) "External Reference Input 2. Leave EXT unconnected in Modes A1, A2. Apply an external voltage in Modes B, C.", 8 INT_THRS2 (in) "Internal Adaptive Threshold 2. Mode configuration pin.", 9 IN2+ (in) "Noninverting Input 2", 10 IN2- (in) "Inverting Input 2", 11 GND (power) "Ground", 12 DIRN (oc) "Rotational Direction Output. Open-drain output, connect a pull up resistor from DIRN to VPULLUP.", 13 ZERO_EN (in) "Zero-Crossing Enable. Mode configuration pin, internally pulled up to VCC with 10k ohm resistor", 14 VCC (power) "Power Supply", 15 IN1- (in) "Noninverting Input 1", 16 IN1+ (in) "Inverting Input 1"

## MAX9927AEE+
designator U?
Dual-Channel, Variable Reluctance Sensor Interface with Adjustable Gain and No Low Power Shutdown, 4.5 to 5.5 V, -40 to 125 degC, 16-Pin SOP (E16+1), Pb-Free; Generic Part Number: MAX9927; PartNumber: MAX9927AEE+; Channels: 2; Industry Qualified: Automotive - AECQ100, Automotive - General; DatasheetVersion: Rev. 4; PackageVersion: Rev. K, 04/2012; PackageReference: E16+1; PackageDescription: 16-Pin Quarter Small-Outline Package (E16+1), Body 4.90 x 3.89 mm, Pitch 0.635 mm; Supplier Part Number 1: MAX9927AEE+-ND; Supplier Part Number 2: 700-MAX9927AEE; Low Pwr. Shutdn: No; Mounting Technology: Surface Mount; Code_JEDEC: MO137; ComponentLink1Description: Manufacturer URL; ComponentLink1URL: http://www.maximintegrated.com/; ComponentLink2Description: Datasheet; ComponentLink2URL: http://datasheets.maximintegrated.com/en/ds/MAX9924-MAX9927.pdf; ComponentLink3Description: Package Specification; ComponentLink3URL: http://pdfserv.maximintegrated.com/package_dwgs/21-0055.PDF
footprint SSOP16_0.635 (Footprint not found)
pins: 1 INT_THRS1 (in) "Internal Adaptive Threshold 1. Mode configuration pin.", 2 EXT1 (in) "External Reference Input 1. Leave EXT unconnected in Modes A1, A2. Apply an external voltage in Modes B, C.", 3 BIAS1 (in) "Input Bias 1. Connect to an external resistor-divider and bypass to ground with a 0.1uF and 10uF capacitor.", 4 COUT1 (oc) "Comparator Output 1. Open-drain output, connect a 10k ohm pullup resistor from COUT1 to VPULLUP.", 5 COUT2 (oc) "Comparator Output 2. Open-drain output, connect a 10k ohm pullup resistor from COUT2 to VPULLUP.", 6 BIAS2 (in) "Input Bias 2. Connect to an external resistor-divider and bypass to ground with a 0.1uF and 10uF capacitor.", 7 EXT2 (in) "External Reference Input 2. Leave EXT unconnected in Modes A1, A2. Apply an external voltage in Modes B, C.", 8 INT_THRS2 (in) "Internal Adaptive Threshold 2. Mode configuration pin.", 9 IN2+ (in) "Noninverting Input 2", 10 IN2- (in) "Inverting Input 2", 11 GND (power) "Ground", 12 OUT2 (out) "Amplifier Output 2", 13 OUT1 (out) "Amplifier Output 1", 14 VCC (power) "Power Supply", 15 IN1- (in) "Noninverting Input 1", 16 IN1+ (in) "Inverting Input 1"

## MAX9927AEE/V+
designator U?
Dual-Channel, Variable Reluctance Sensor Interface with Adjustable Gain and No Low Power Shutdown, 4.5 to 5.5 V, -40 to 125 degC, 16-Pin SOP (E16+1), Pb-Free; Generic Part Number: MAX9927; PartNumber: MAX9927AEE/V+; Channels: 2; Industry Qualified: Automotive - AECQ100, Automotive - General; DatasheetVersion: Rev. 4; PackageVersion: Rev. K, 04/2012; PackageReference: E16+1; PackageDescription: 16-Pin Quarter Small-Outline Package (E16+1), Body 4.90 x 3.89 mm, Pitch 0.635 mm; Supplier Part Number 1: MAX9927AEE/V+-ND; Supplier Part Number 2: 700-MAX9927AEE/V+; Low Pwr. Shutdn: No; Mounting Technology: Surface Mount; Code_JEDEC: MO137; ComponentLink1Description: Manufacturer URL; ComponentLink1URL: http://www.maximintegrated.com/; ComponentLink2Description: Datasheet; ComponentLink2URL: http://datasheets.maximintegrated.com/en/ds/MAX9924-MAX9927.pdf; ComponentLink3Description: Package Specification; ComponentLink3URL: http://pdfserv.maximintegrated.com/package_dwgs/21-0055.PDF
footprint SSOP16_0.635 (Footprint not found)
pins: 1 INT_THRS1 (in) "Internal Adaptive Threshold 1. Mode configuration pin.", 2 EXT1 (in) "External Reference Input 1. Leave EXT unconnected in Modes A1, A2. Apply an external voltage in Modes B, C.", 3 BIAS1 (in) "Input Bias 1. Connect to an external resistor-divider and bypass to ground with a 0.1uF and 10uF capacitor.", 4 COUT1 (oc) "Comparator Output 1. Open-drain output, connect a 10k ohm pullup resistor from COUT1 to VPULLUP.", 5 COUT2 (oc) "Comparator Output 2. Open-drain output, connect a 10k ohm pullup resistor from COUT2 to VPULLUP.", 6 BIAS2 (in) "Input Bias 2. Connect to an external resistor-divider and bypass to ground with a 0.1uF and 10uF capacitor.", 7 EXT2 (in) "External Reference Input 2. Leave EXT unconnected in Modes A1, A2. Apply an external voltage in Modes B, C.", 8 INT_THRS2 (in) "Internal Adaptive Threshold 2. Mode configuration pin.", 9 IN2+ (in) "Noninverting Input 2", 10 IN2- (in) "Inverting Input 2", 11 GND (power) "Ground", 12 OUT2 (out) "Amplifier Output 2", 13 OUT1 (out) "Amplifier Output 1", 14 VCC (power) "Power Supply", 15 IN1- (in) "Noninverting Input 1", 16 IN1+ (in) "Inverting Input 1"